# Altium schematic symbol library LATTICEPLDS_Library.SchLib: 291 symbols (part 19 of 32) (continued)
## LFE5U-45F-BG381 (continued)
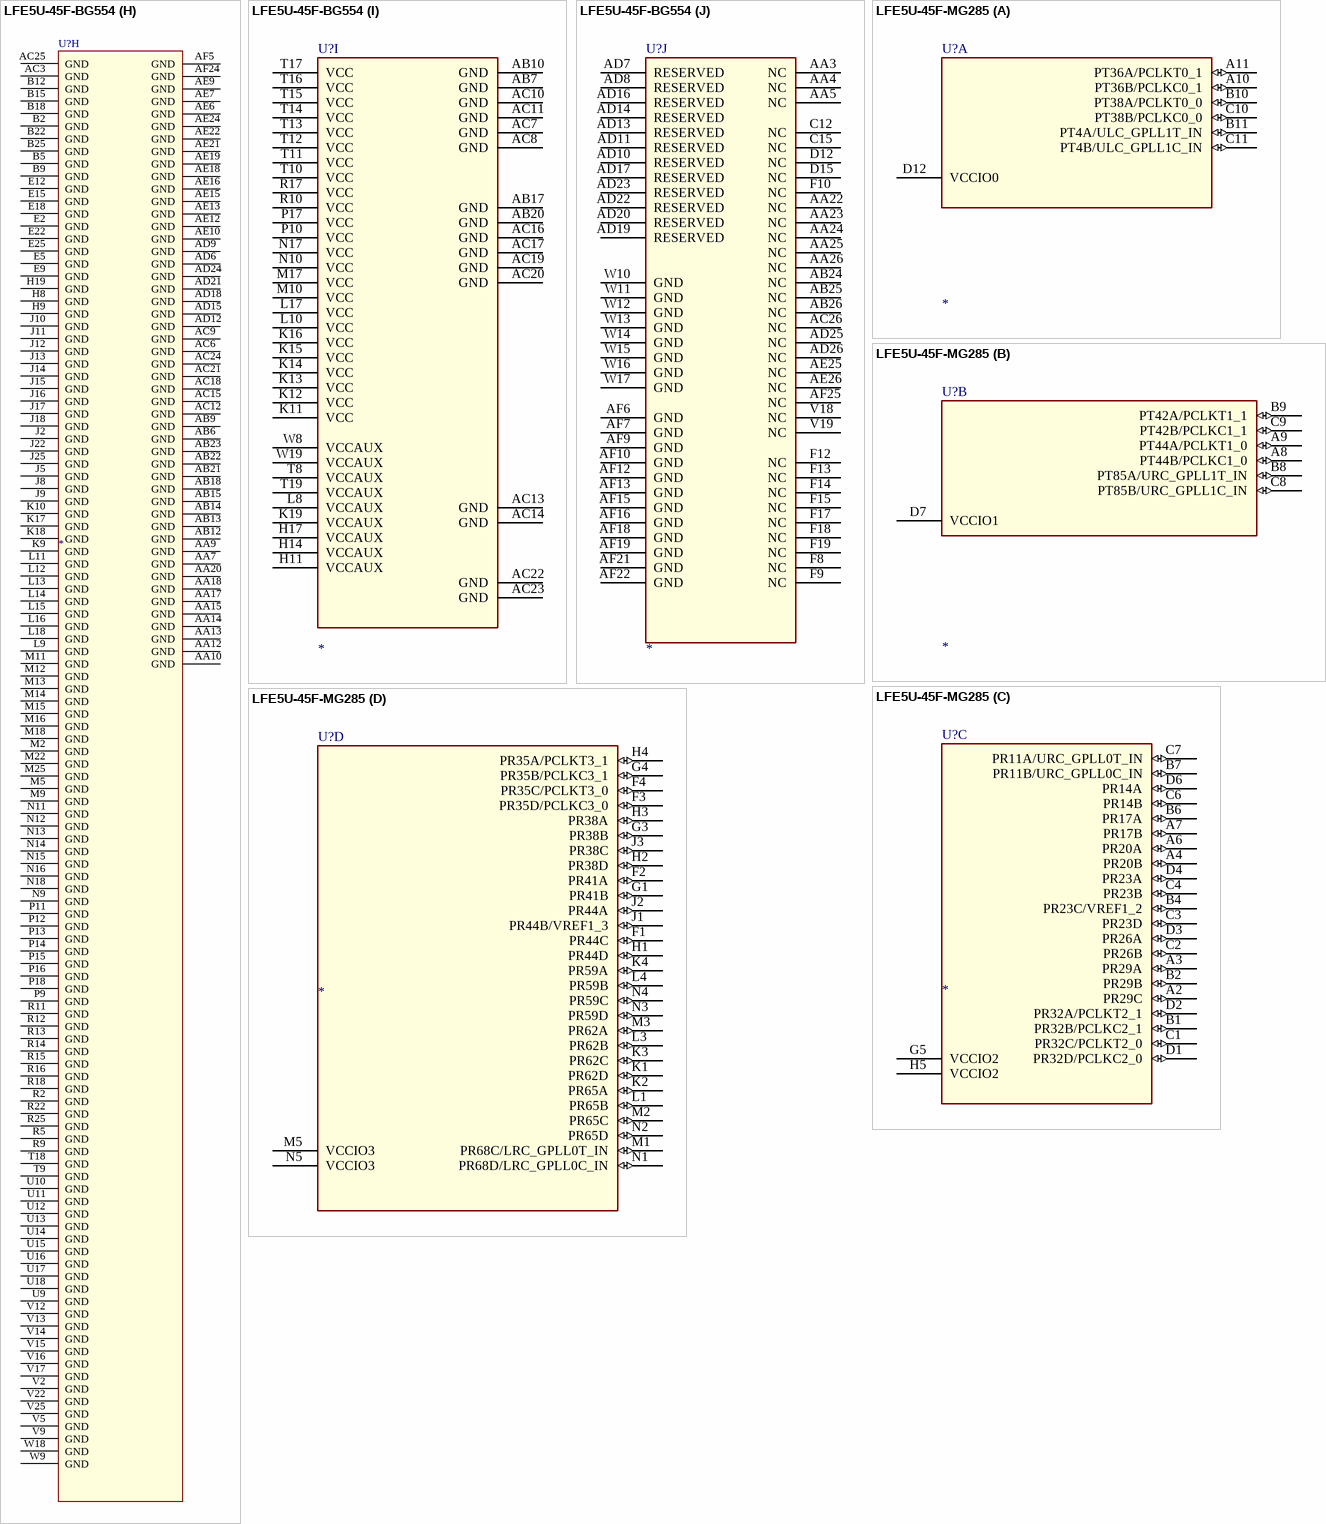
[diagram p180: symbols LFE5U-45F-BG554 to LFE5U-45F-MG285]

## LFE5U-45F-BG554
designator U?
SWAP_INFO: (S1+S2+S3+S4+S5+S6+S7+S8+S9+S10); SPLIT_INST: TRUE
part A pins: A2 PT4A/ ULC_GPLL1T_IN (io), A3 PT4B/ ULC_GPLL1C_IN (io), A4 PT6B (io), A5 PT15A (io), A6 PT15B (io), A8 PT18A (io), A9 PT18B (io), A10 PT31A (io), A11 PT31B (io), A12 PT38A/ PCLKT0_0 (io), A13 PT38B/ PCLKC0_0 (io), B4 PT6A (io), B6 PT13B (io), B8 PT20A (io), B10 PT29B (io), B11 PT33B/ GR_PCLK0_0 (io), C5 PT9B (io), C6 PT13A (io), C8 PT20B (io), C9 PT24B (io), C10 PT29A (io), C11 PT33A/ GR_PCLK0_1 (io), D5 PT9A (io), D6 PT11B (io), D8 PT22B (io), D9 PT24A (io), D10 PT27B (io), D11 PT36B/ PCLKC0_1 (io), E6 PT11A (io), E8 PT22A (io), E10 PT27A (io), E11 PT36A/ PCLKT0_1 (io), H10 VCCIO0 (power), H12 VCCIO0 (power), H13 VCCIO0 (power)
part B pins: A14 PT51A (io), A15 PT51B (io), A16 PT58A (io), A17 PT58B (io), A18 PT71A (io), A19 PT71B (io), A21 PT74A (io), A22 PT74B (io), A23 PT83A (io), A24 PT85A/ URC_GPLL1T_IN (io), A25 PT85B/ URC_GPLL1C_IN (io), B13 PT49A (io), B14 PT49B (io), B16 PT56A (io), B17 PT60A (io), B19 PT69B (io), B21 PT76A (io), B23 PT83B (io), C13 PT47A/ GR_PCLK1_0 (io), C14 PT47B/ GR_PCLK1_1 (io), C16 PT56B (io), C17 PT60B (io), C18 PT65A (io), C19 PT69A (io), C21 PT76B (io), C22 PT80A (io), D13 PT44A/ PCLKT1_0 (io), D14 PT44B/ PCLKC1_0 (io), D16 PT53A (io), D17 PT62A (io), D18 PT65B (io), D19 PT67B (io), D21 PT78A (io), D22 PT80B (io), E13 PT42A/ PCLKT1_1 (io), E14 PT42B/ PCLKC1_1 (io), E16 PT53B (io), E17 PT62B (io), E19 PT67A (io), E21 PT78B (io), H15 VCCIO1 (power), H16 VCCIO1 (power), H18 VCCIO1 (power)
part C pins: B24 PR14D (io), B26 PR14C (io), C23 PR11C (io), C24 PR11D (io), C25 PR11A/ URC_GPLL0T_IN (io), C26 PR11B/ URC_GPLL0C_IN (io), D23 PR14A (io), D24 PR14B (io), D25 PR17A (io), D26 PR17D (io), E23 PR20C (io), E24 PR17C (io), E26 PR17B (io), F22 PR23A (io), F23 PR23B (io), F24 PR20D (io), F25 PR20A (io), F26 PR20B (io), H21 PR23D (io), H22 PR23C/ VREF1_2 (io), H23 PR26C (io), J19 VCCIO2 (power), J21 PR26A (io), J23 PR29B (io), K21 PR26B (io), K22 PR29A/ GR_PCLK2_1 (io), K23 PR32A/ PCLKT2_1 (io), L19 VCCIO2 (power), L22 PR26D (io), L23 PR32B/ PCLKC2_1 (io), M19 VCCIO2 (power), M21 PR29C/ GR_PCLK2_0 (io), M23 PR29D (io), N19 VCCIO2 (power), N21 PR32C/ PCLKT2_0 (io), N22 PR32D/ PCLKC2_0 (io)
part D pins: H24 PR35A/ PCLKT3_1 (io), H25 PR35C/ PCLKT3_0 (io), H26 PR35D/ PCLKC3_0 (io), J24 PR35B/ PCLKC3_1 (io), J26 PR38B (io), K24 PR38C/ GR_PCLK3_1 (io), K25 PR38A/ GR_PCLK3_0 (io), K26 PR41C (io), L24 PR38D (io), L25 PR41A (io), L26 PR41D (io), M24 PR44D (io), M26 PR41B (io), N23 PR47D (io), N24 PR44C (io), N25 PR44B/ VREF1_3 (io), N26 PR44A (io), P19 VCCIO3 (power), P21 PR47C (io), P22 PR47B (io), P23 PR47A (io), P24 PR59D (io), P25 PR62A (io), P26 PR62B (io), R19 VCCIO3 (power), R21 PR50C (io), R23 PR50A (io), R24 PR59C (io), R26 PR62D (io), T22 PR50B (io), T23 PR50D (io), T24 PR59A (io), T25 PR62C (io), T26 PR65D (io), U19 VCCIO3 (power), U21 PR53C (io), U22 PR53B (io), U23 PR53D (io), U24 PR59B (io), U25 PR65B (io), U26 PR65C (io), V21 PR56B (io), V23 PR53A (io), V24 PR68A (io), V26 PR65A (io), W21 PR56D (io), W22 PR56C (io), W23 PR56A (io), W24 PR68D/ LRC_GPLL0C_IN (io), W25 PR68C/ LRC_GPLL0T_IN (io), W26 PR68B (io)
part E pins: H1 PL35D/ PCLKC6_0 (io), H2 PL35C/ PCLKT6_0 (io), H3 PL35A/ PCLKT6_1 (io), J1 PL38B (io), J3 PL35B/ PCLKC6_1 (io), K1 PL41C (io), K2 PL38A/ GR_PCLK6_0 (io), K3 PL38C/ GR_PCLK6_1 (io), L1 PL41D (io), L2 PL41A (io), L3 PL38D (io), M1 PL41B (io), M3 PL44D (io), N1 PL44A (io), N2 PL44B/ VREF1_6 (io), N3 PL44C (io), N4 PL47D (io), P1 PL62B (io), P2 PL62A (io), P3 PL59D (io), P4 PL47A (io), P5 PL47B (io), P6 PL47C (io), P8 VCCIO6 (power), R1 PL62D (io), R3 PL59C (io), R4 PL50A (io), R6 PL50C (io), R8 VCCIO6 (power), T1 PL65D (io), T2 PL62C (io), T3 PL59A (io), T4 PL50D (io), T5 PL50B (io), U1 PL65C (io), U2 PL65B (io), U3 PL59B (io), U4 PL53D (io), U5 PL53B (io), U6 PL53C (io), U8 VCCIO6 (power), V1 PL65A (io), V3 PL68A (io), V4 PL53A (io), V6 PL56B (io), V8 VCCIO6 (power), W1 PL68B (io), W2 PL68C/ LLC_GPLL0T_IN (io), W3 PL68D/ LLC_GPLL0C_IN (io), W4 PL56A (io), W5 PL56C (io), W6 PL56D (io)
part F pins: B1 PL14C (io), B3 PL14D (io), C1 PL11B/ ULC_GPLL0C_IN (io), C2 PL11A/ ULC_GPLL0T_IN (io), C3 PL11D (io), C4 PL11C (io), D1 PL17D (io), D2 PL17A (io), D3 PL14B (io), D4 PL14A (io), E1 PL17B (io), E3 PL17C (io), E4 PL20C (io), F1 PL20B (io), F2 PL20A (io), F3 PL20D (io), F4 PL23B (io), F5 PL23A (io), H4 PL26C (io), H5 PL23C/ VREF1_7 (io), H6 PL23D (io), J4 PL29B (io), J6 PL26A (io), K4 PL32A/ PCLKT7_1 (io), K5 PL29A/ GR_PCLK7_1 (io), K6 PL26B (io), K8 VCCIO7 (power), L4 PL32B/ PCLKC7_1 (io), L5 PL26D (io), M4 PL29D (io), M6 PL29C/ GR_PCLK7_0 (io), M8 VCCIO7 (power), N5 PL32D/ PCLKC7_0 (io), N6 PL32C/ PCLKT7_0 (io), N8 VCCIO7 (power)
part G pins: AA1 PB4A/ D7/IO7 (io), AA2 PB15A/ HOLDN/DI/BUSY/CSSPIN/CEN (io), AB1 PB4B/ D6/IO6 (io), AB2 PB13A/ SN/CSN (io), AB3 PB15B/ DOUT/CSON (io), AB4 PROGRAMN (io), AB5 TDO (io), AC1 PB6A/ D5/MISO2/IO5 (io), AC2 PB13B/ CS1N (io), AC4 DONE (io), AC5 TDI (io), AD1 PB6B/ D4/MOSI2/IO4 (io), AD2 PB11A/ D1/MISO/IO1 (io), AD3 PB18A/ WRITEN (io), AD4 CFG_2 (io), AD5 TCK (io), AE1 PB9A/ D3/IO3 (io), AE2 PB11B/ D0/MOSI/IO0 (io), AE3 CCLK/ MCLK/SCK (io), AE4 CFG_1 (io), AE5 TMS (io), AF2 PB9B/ D2/IO2 (io), AF3 INITN (io), AF4 CFG_0 (io), V10 VCCIO8 (power), V11 VCCIO8 (power)
part H pins: AA7 GND (power), AA9 GND (power), AA10 GND (power), AA12 GND (power), AA13 GND (power), AA14 GND (power), AA15 GND (power), AA17 GND (power), AA18 GND (power), AA20 GND (power), AB6 GND (power), AB9 GND (power), AB12 GND (power), AB13 GND (power), AB14 GND (power), AB15 GND (power), AB18 GND (power), AB21 GND (power), AB22 GND (power), AB23 GND (power), AC3 GND (power), AC6 GND (power), AC9 GND (power), AC12 GND (power), AC15 GND (power), AC18 GND (power), AC21 GND (power), AC24 GND (power), AC25 GND (power), AD6 GND (power), AD9 GND (power), AD12 GND (power), AD15 GND (power), AD18 GND (power), AD21 GND (power), AD24 GND (power), AE6 GND (power), AE7 GND (power), AE9 GND (power), AE10 GND (power), AE12 GND (power), AE13 GND (power), AE15 GND (power), AE16 GND (power), AE18 GND (power), AE19 GND (power), AE21 GND (power), AE22 GND (power), AE24 GND (power), AF5 GND (power), AF24 GND (power), B2 GND (power), B5 GND (power), B9 GND (power), B12 GND (power), B15 GND (power), B18 GND (power), B22 GND (power), B25 GND (power), E2 GND (power), E5 GND (power), E9 GND (power), E12 GND (power), E15 GND (power), E18 GND (power), E22 GND (power), E25 GND (power), H8 GND (power), H9 GND (power), H19 GND (power), J2 GND (power), J5 GND (power), J8 GND (power), J9 GND (power), J10 GND (power), J11 GND (power), J12 GND (power), J13 GND (power), J14 GND (power), J15 GND (power), J16 GND (power), J17 GND (power), J18 GND (power), J22 GND (power), J25 GND (power), K9 GND (power), K10 GND (power), K17 GND (power), K18 GND (power), L9 GND (power), L11 GND (power), L12 GND (power), L13 GND (power), L14 GND (power), L15 GND (power), L16 GND (power), L18 GND (power), M2 GND (power), M5 GND (power), M9 GND (power), M11 GND (power), M12 GND (power), M13 GND (power), M14 GND (power), M15 GND (power), M16 GND (power), M18 GND (power), M22 GND (power), M25 GND (power), N9 GND (power), N11 GND (power), N12 GND (power), N13 GND (power), N14 GND (power), N15 GND (power), N16 GND (power), N18 GND (power), P9 GND (power), P11 GND (power), P12 GND (power), P13 GND (power), P14 GND (power), P15 GND (power), P16 GND (power), P18 GND (power), R2 GND (power), R5 GND (power), R9 GND (power), R11 GND (power), R12 GND (power), R13 GND (power), R14 GND (power), R15 GND (power), R16 GND (power), R18 GND (power), R22 GND (power), R25 GND (power), T9 GND (power), T18 GND (power), U9 GND (power), U10 GND (power), U11 GND (power), U12 GND (power), U13 GND (power), U14 GND (power), U15 GND (power), U16 GND (power), U17 GND (power), U18 GND (power), V2 GND (power), V5 GND (power), V9 GND (power), V12 GND (power), V13 GND (power), V14 GND (power), V15 GND (power), V16 GND (power), V17 GND (power), V22 GND (power), V25 GND (power), W9 GND (power), W18 GND (power)
part I pins: AB7 GND (power), AB10 GND (power), AB17 GND (power), AB20 GND (power), AC7 GND (power), AC8 GND (power), AC10 GND (power), AC11 GND (power), AC13 GND (power), AC14 GND (power), AC16 GND (power), AC17 GND (power), AC19 GND (power), AC20 GND (power), AC22 GND (power), AC23 GND (power), H11 VCCAUX (power), H14 VCCAUX (power), H17 VCCAUX (power), K11 VCC (power), K12 VCC (power), K13 VCC (power), K14 VCC (power), K15 VCC (power), K16 VCC (power), K19 VCCAUX (power), L8 VCCAUX (power), L10 VCC (power), L17 VCC (power), M10 VCC (power), M17 VCC (power), N10 VCC (power), N17 VCC (power), P10 VCC (power), P17 VCC (power), R10 VCC (power), R17 VCC (power), T8 VCCAUX (power), T10 VCC (power), T11 VCC (power), T12 VCC (power), T13 VCC (power), T14 VCC (power), T15 VCC (power), T16 VCC (power), T17 VCC (power), T19 VCCAUX (power), W8 VCCAUX (power), W19 VCCAUX (power)
part J pins: AA3 NC (power), AA4 NC (power), AA5 NC (power), AA22 NC (power), AA23 NC (power), AA24 NC (power), AA25 NC (power), AA26 NC (power), AB24 NC (power), AB25 NC (power), AB26 NC (power), AC26 NC (power), AD7 RESERVED (power), AD8 RESERVED (power), AD10 RESERVED (power), AD11 RESERVED (power), AD13 RESERVED (power), AD14 RESERVED (power), AD16 RESERVED (power), AD17 RESERVED (power), AD19 RESERVED (power), AD20 RESERVED (power), AD22 RESERVED (power), AD23 RESERVED (power), AD25 NC (power), AD26 NC (power), AE25 NC (power), AE26 NC (power), AF6 GND (power), AF7 GND (power), AF9 GND (power), AF10 GND (power), AF12 GND (power), AF13 GND (power), AF15 GND (power), AF16 GND (power), AF18 GND (power), AF19 GND (power), AF21 GND (power), AF22 GND (power), AF25 NC (power), C12 NC (power), C15 NC (power), D12 NC (power), D15 NC (power), F8 NC (power), F9 NC (power), F10 NC (power), F12 NC (power), F13 NC (power), F14 NC (power), F15 NC (power), F17 NC (power), F18 NC (power), F19 NC (power), V18 NC (power), V19 NC (power), W10 GND (power), W11 GND (power), W12 GND (power), W13 GND (power), W14 GND (power), W15 GND (power), W16 GND (power), W17 GND (power)

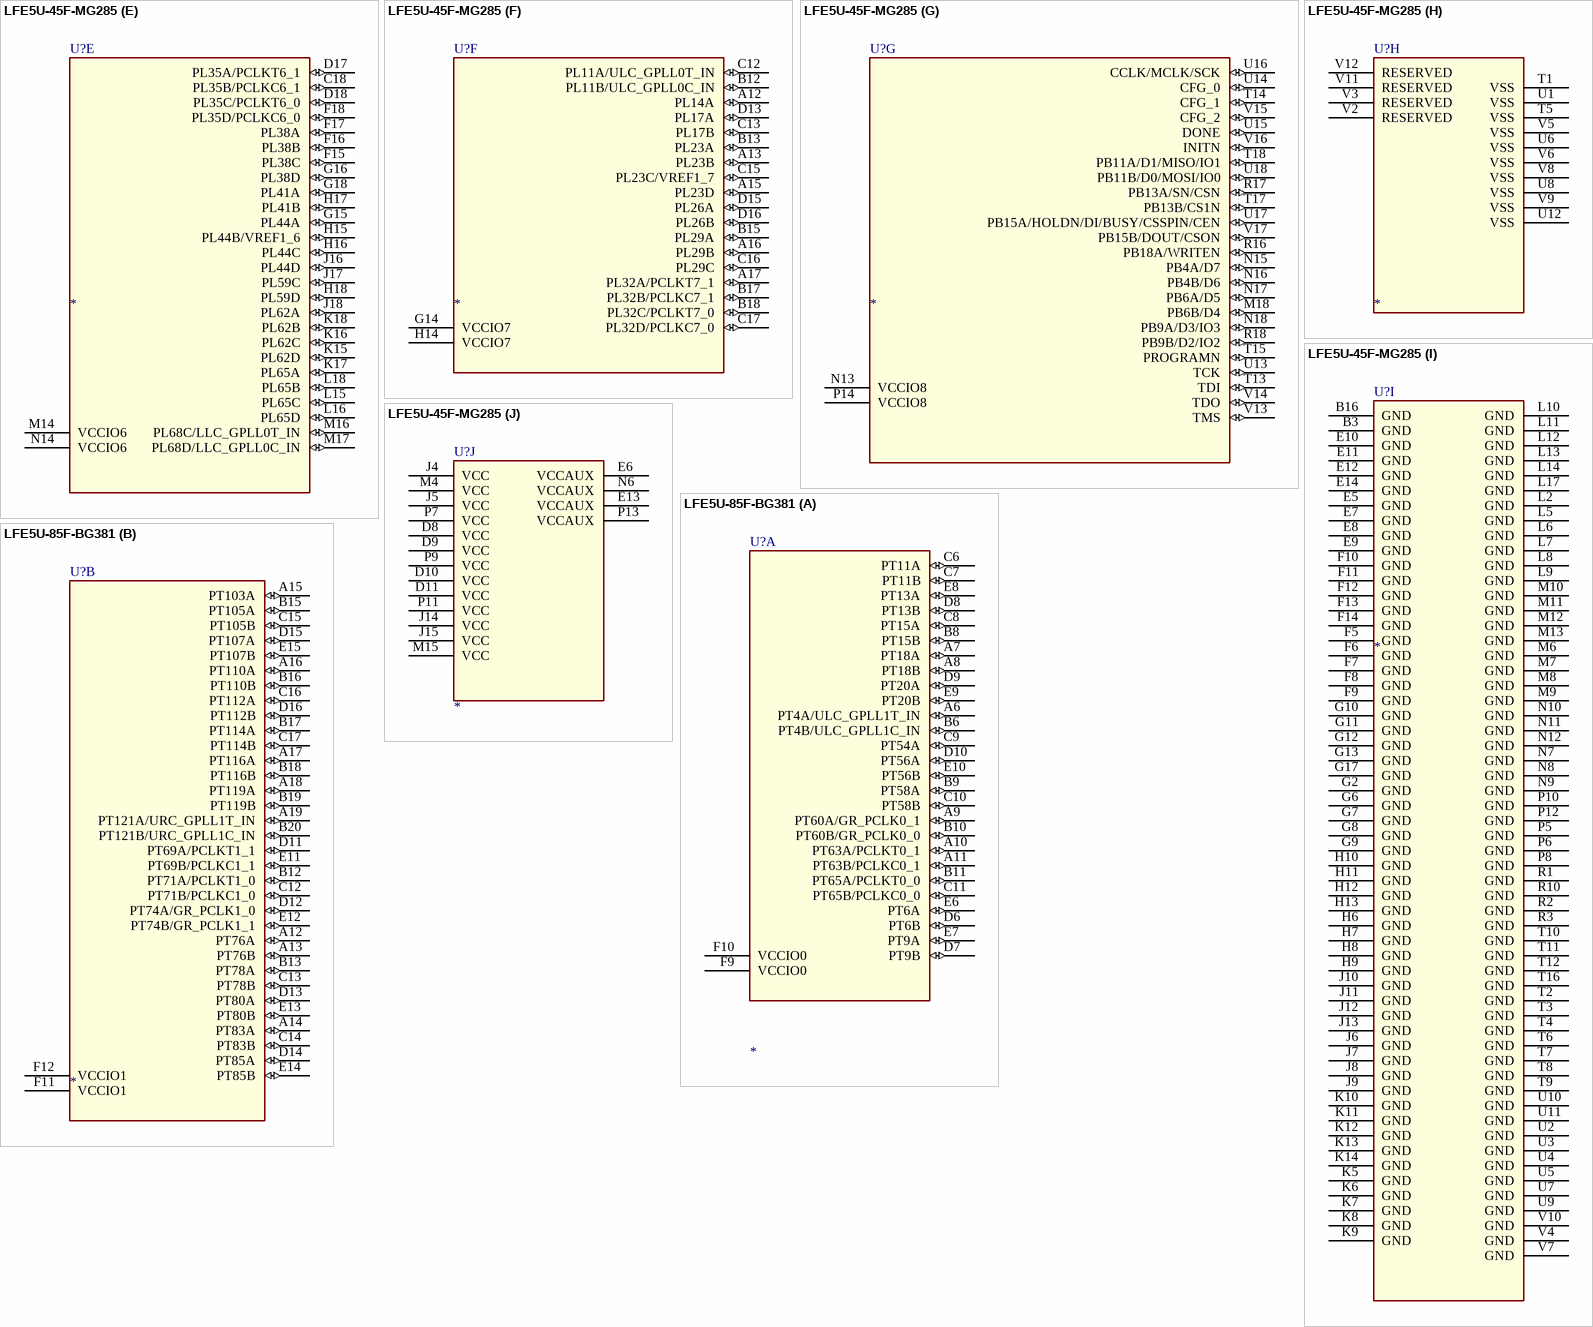
[diagram p181: symbols LFE5U-45F-MG285 to LFE5U-85F-BG381]

## LFE5U-45F-MG285
designator U?
SWAP_INFO: (S1+S2+S3+S4+S5+S6+S7+S8+S9+S10); SPLIT_INST: TRUE
part A pins: A10 PT36B/PCLKC0_1 (io), A11 PT36A/PCLKT0_1 (io), B10 PT38A/PCLKT0_0 (io), B11 PT4A/ULC_GPLL1T_IN (io), C10 PT38B/PCLKC0_0 (io), C11 PT4B/ULC_GPLL1C_IN (io), D12 VCCIO0 (power)
part B pins: A8 PT44B/PCLKC1_0 (io), A9 PT44A/PCLKT1_0 (io), B8 PT85A/URC_GPLL1T_IN (io), B9 PT42A/PCLKT1_1 (io), C8 PT85B/URC_GPLL1C_IN (io), C9 PT42B/PCLKC1_1 (io), D7 VCCIO1 (power)
part C pins: A2 PR29C (io), A3 PR29A (io), A4 PR20B (io), A6 PR20A (io), A7 PR17B (io), B1 PR32B/PCLKC2_1 (io), B2 PR29B (io), B4 PR23C/VREF1_2 (io), B6 PR17A (io), B7 PR11B/URC_GPLL0C_IN (io), C1 PR32C/PCLKT2_0 (io), C2 PR26B (io), C3 PR23D (io), C4 PR23B (io), C6 PR14B (io), C7 PR11A/URC_GPLL0T_IN (io), D1 PR32D/PCLKC2_0 (io), D2 PR32A/PCLKT2_1 (io), D3 PR26A (io), D4 PR23A (io), D6 PR14A (io), G5 VCCIO2 (power), H5 VCCIO2 (power)
part D pins: F1 PR44C (io), F2 PR41A (io), F3 PR35D/PCLKC3_0 (io), F4 PR35C/PCLKT3_0 (io), G1 PR41B (io), G3 PR38B (io), G4 PR35B/PCLKC3_1 (io), H1 PR44D (io), H2 PR38D (io), H3 PR38A (io), H4 PR35A/PCLKT3_1 (io), J1 PR44B/VREF1_3 (io), J2 PR44A (io), J3 PR38C (io), K1 PR62D (io), K2 PR65A (io), K3 PR62C (io), K4 PR59A (io), L1 PR65B (io), L3 PR62B (io), L4 PR59B (io), M1 PR68C/LRC_GPLL0T_IN (io), M2 PR65C (io), M3 PR62A (io), M5 VCCIO3 (power), N1 PR68D/LRC_GPLL0C_IN (io), N2 PR65D (io), N3 PR59D (io), N4 PR59C (io), N5 VCCIO3 (power)
part E pins: C18 PL35B/PCLKC6_1 (io), D17 PL35A/PCLKT6_1 (io), D18 PL35C/PCLKT6_0 (io), F15 PL38C (io), F16 PL38B (io), F17 PL38A (io), F18 PL35D/PCLKC6_0 (io), G15 PL44A (io), G16 PL38D (io), G18 PL41A (io), H15 PL44B/VREF1_6 (io), H16 PL44C (io), H17 PL41B (io), H18 PL59D (io), J16 PL44D (io), J17 PL59C (io), J18 PL62A (io), K15 PL62D (io), K16 PL62C (io), K17 PL65A (io), K18 PL62B (io), L15 PL65C (io), L16 PL65D (io), L18 PL65B (io), M14 VCCIO6 (power), M16 PL68C/LLC_GPLL0T_IN (io), M17 PL68D/LLC_GPLL0C_IN (io), N14 VCCIO6 (power)
part F pins: A12 PL14A (io), A13 PL23B (io), A15 PL23D (io), A16 PL29B (io), A17 PL32A/PCLKT7_1 (io), B12 PL11B/ULC_GPLL0C_IN (io), B13 PL23A (io), B15 PL29A (io), B17 PL32B/PCLKC7_1 (io), B18 PL32C/PCLKT7_0 (io), C12 PL11A/ULC_GPLL0T_IN (io), C13 PL17B (io), C15 PL23C/VREF1_7 (io), C16 PL29C (io), C17 PL32D/PCLKC7_0 (io), D13 PL17A (io), D15 PL26A (io), D16 PL26B (io), G14 VCCIO7 (power), H14 VCCIO7 (power)
part G pins: M18 PB6B/D4 (io), N13 VCCIO8 (power), N15 PB4A/D7 (io), N16 PB4B/D6 (io), N17 PB6A/D5 (io), N18 PB9A/D3/IO3 (io), P14 VCCIO8 (power), R16 PB18A/WRITEN (io), R17 PB13A/SN/CSN (io), R18 PB9B/D2/IO2 (io), T13 TDI (io), T14 CFG_1 (io), T15 PROGRAMN (io), T17 PB13B/CS1N (io), T18 PB11A/D1/MISO/IO1 (io), U13 TCK (io), U14 CFG_0 (io), U15 DONE (io), U16 CCLK/MCLK/SCK (io), U17 PB15A/HOLDN/DI/BUSY/CSSPIN/CEN (io), U18 PB11B/D0/MOSI/IO0 (io), V13 TMS (io), V14 TDO (io), V15 CFG_2 (io), V16 INITN (io), V17 PB15B/DOUT/CSON (io)
part H pins: T1 VSS (power), T5 VSS (power), U1 VSS (power), U6 VSS (power), U8 VSS (power), U12 VSS (power), V2 RESERVED (power), V3 RESERVED (power), V5 VSS (power), V6 VSS (power), V8 VSS (power), V9 VSS (power), V11 RESERVED (power), V12 RESERVED (power)
part I pins: B3 GND (power), B16 GND (power), E5 GND (power), E7 GND (power), E8 GND (power), E9 GND (power), E10 GND (power), E11 GND (power), E12 GND (power), E14 GND (power), F5 GND (power), F6 GND (power), F7 GND (power), F8 GND (power), F9 GND (power), F10 GND (power), F11 GND (power), F12 GND (power), F13 GND (power), F14 GND (power), G2 GND (power), G6 GND (power), G7 GND (power), G8 GND (power), G9 GND (power), G10 GND (power), G11 GND (power), G12 GND (power), G13 GND (power), G17 GND (power), H6 GND (power), H7 GND (power), H8 GND (power), H9 GND (power), H10 GND (power), H11 GND (power), H12 GND (power), H13 GND (power), J6 GND (power), J7 GND (power), J8 GND (power), J9 GND (power), J10 GND (power), J11 GND (power), J12 GND (power), J13 GND (power), K5 GND (power), K6 GND (power), K7 GND (power), K8 GND (power), K9 GND (power), K10 GND (power), K11 GND (power), K12 GND (power), K13 GND (power), K14 GND (power), L2 GND (power), L5 GND (power), L6 GND (power), L7 GND (power), L8 GND (power), L9 GND (power), L10 GND (power), L11 GND (power), L12 GND (power), L13 GND (power), L14 GND (power), L17 GND (power), M6 GND (power), M7 GND (power), M8 GND (power), M9 GND (power), M10 GND (power), M11 GND (power), M12 GND (power), M13 GND (power), N7 GND (power), N8 GND (power), N9 GND (power), N10 GND (power), N11 GND (power), N12 GND (power), P5 GND (power), P6 GND (power), P8 GND (power), P10 GND (power), P12 GND (power), R1 GND (power), R2 GND (power), R3 GND (power), R10 GND (power), T2 GND (power), T3 GND (power), T4 GND (power), T6 GND (power), T7 GND (power), T8 GND (power), T9 GND (power), T10 GND (power), T11 GND (power), T12 GND (power), T16 GND (power), U2 GND (power), U3 GND (power), U4 GND (power), U5 GND (power), U7 GND (power), U9 GND (power), U10 GND (power), U11 GND (power), V4 GND (power), V7 GND (power), V10 GND (power)
part J pins: D8 VCC (power), D9 VCC (power), D10 VCC (power), D11 VCC (power), E6 VCCAUX (power), E13 VCCAUX (power), J4 VCC (power), J5 VCC (power), J14 VCC (power), J15 VCC (power), M4 VCC (power), M15 VCC (power), N6 VCCAUX (power), P7 VCC (power), P9 VCC (power), P11 VCC (power), P13 VCCAUX (power)

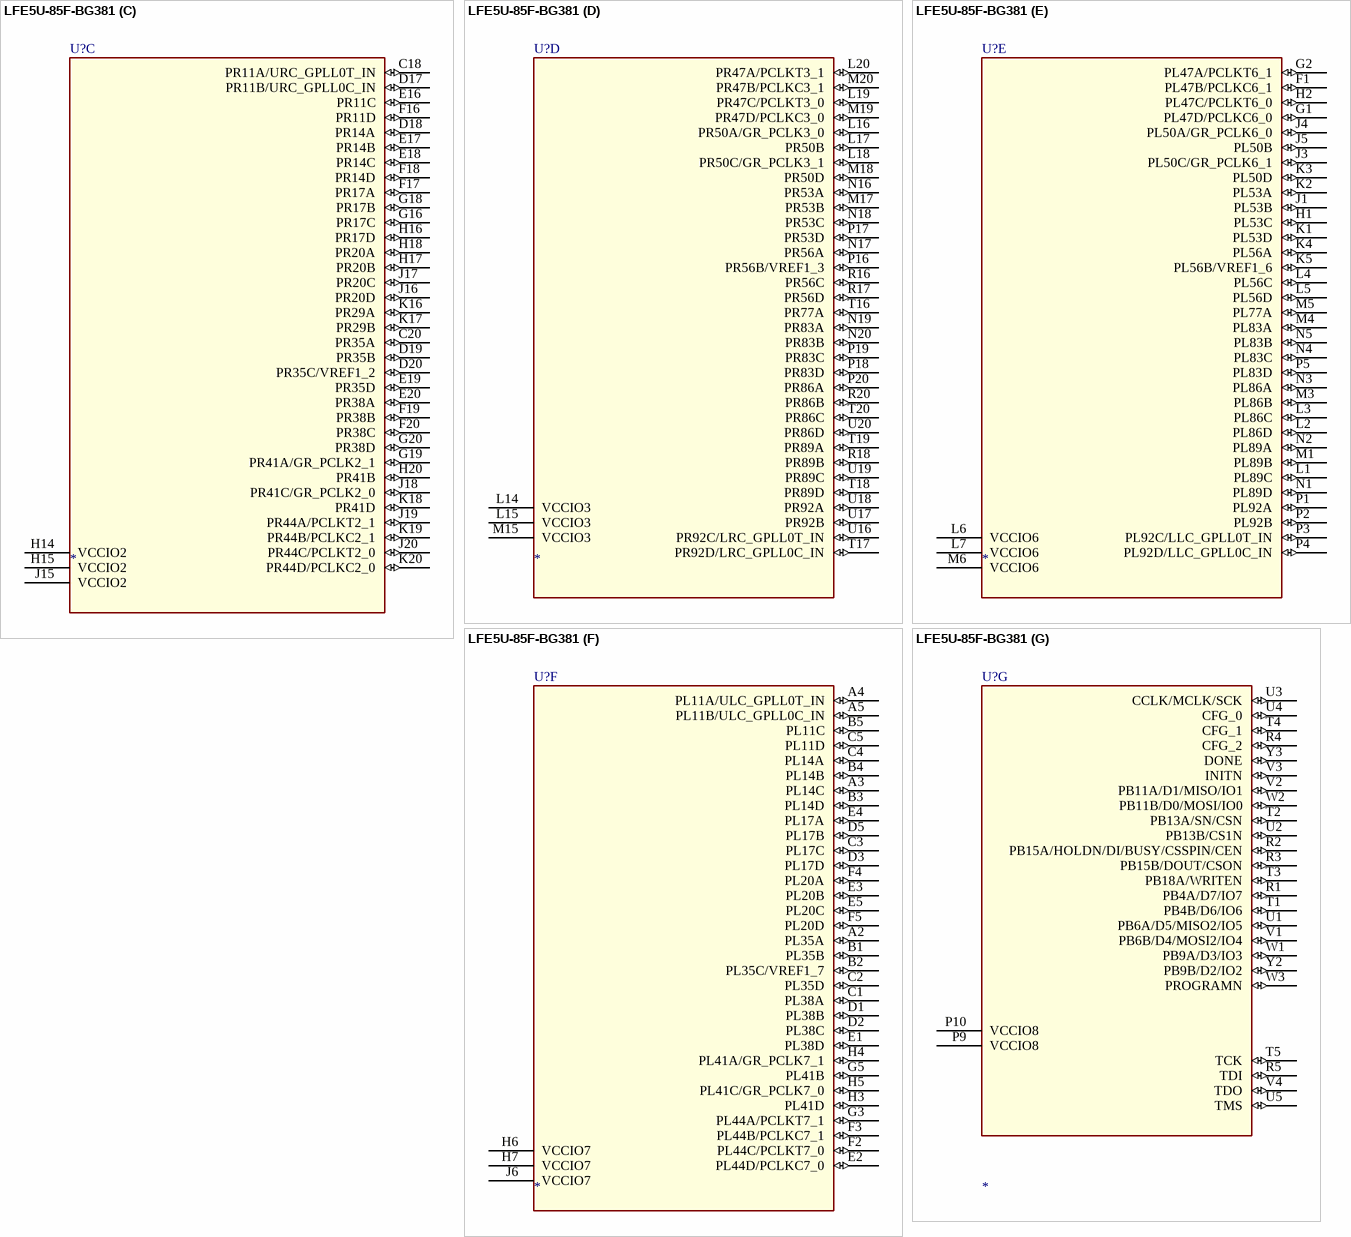
[diagram p182: symbol LFE5U-85F-BG381]

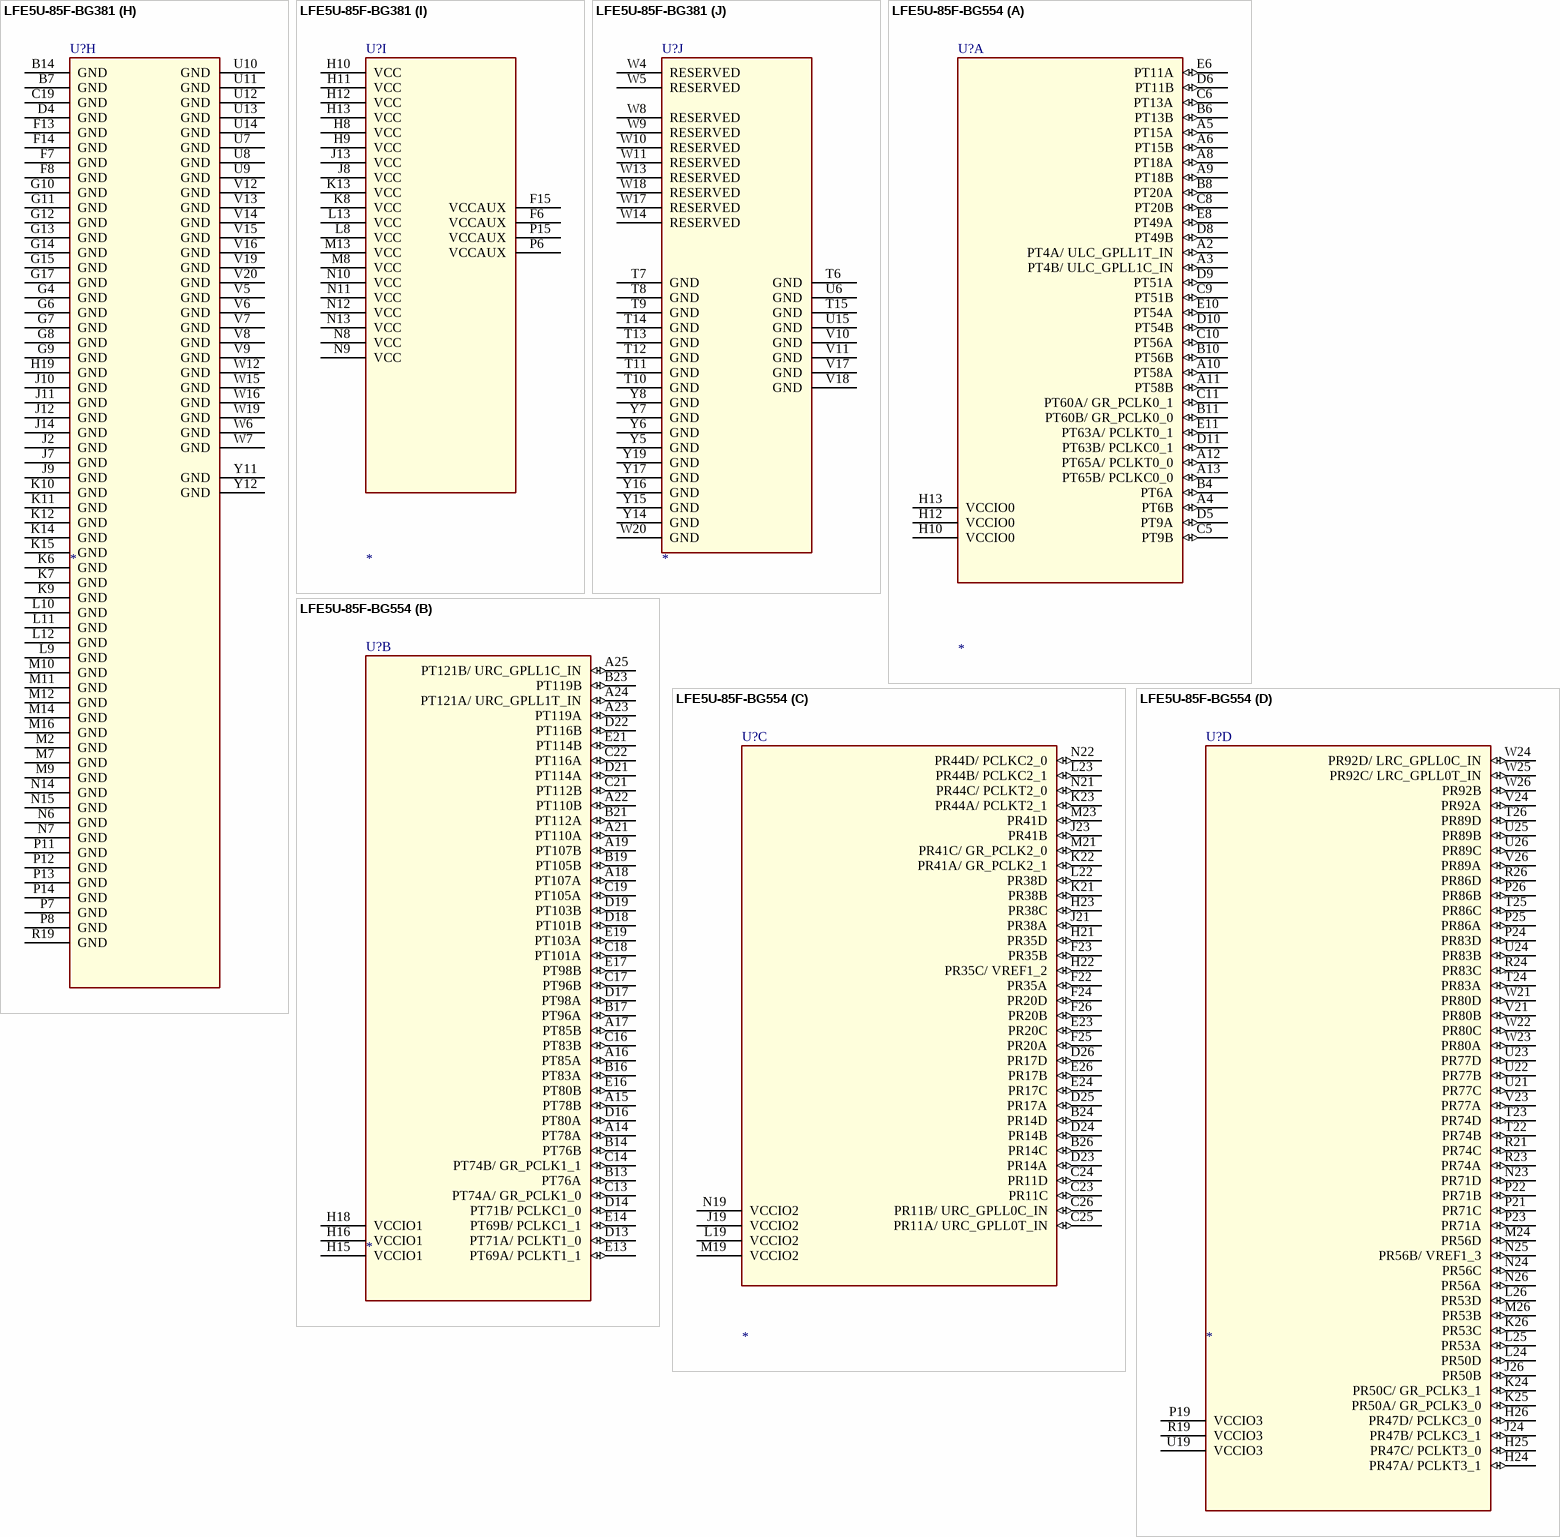
[diagram p183: symbols LFE5U-85F-BG381 to LFE5U-85F-BG554]

## LFE5U-85F-BG381
designator U?
SPLIT_INST: TRUE; SWAP_INFO: (S1+S2+S3+S4+S5+S6+S7+S8+S9+S10)
part A pins: A6 PT4A/ULC_GPLL1T_IN (io), A7 PT18A (io), A8 PT18B (io), A9 PT60A/GR_PCLK0_1 (io), A10 PT63A/PCLKT0_1 (io), A11 PT63B/PCLKC0_1 (io), B6 PT4B/ULC_GPLL1C_IN (io), B8 PT15B (io), B9 PT58A (io), B10 PT60B/GR_PCLK0_0 (io), B11 PT65A/PCLKT0_0 (io), C6 PT11A (io), C7 PT11B (io), C8 PT15A (io), C9 PT54A (io), C10 PT58B (io), C11 PT65B/PCLKC0_0 (io), D6 PT6B (io), D7 PT9B (io), D8 PT13B (io), D9 PT20A (io), D10 PT56A (io), E6 PT6A (io), E7 PT9A (io), E8 PT13A (io), E9 PT20B (io), E10 PT56B (io), F9 VCCIO0 (power), F10 VCCIO0 (power)
part B pins: A12 PT76A (io), A13 PT76B (io), A14 PT83A (io), A15 PT103A (io), A16 PT110A (io), A17 PT116A (io), A18 PT119A (io), A19 PT121A/URC_GPLL1T_IN (io), B12 PT71A/PCLKT1_0 (io), B13 PT78A (io), B15 PT105A (io), B16 PT110B (io), B17 PT114A (io), B18 PT116B (io), B19 PT119B (io), B20 PT121B/URC_GPLL1C_IN (io), C12 PT71B/PCLKC1_0 (io), C13 PT78B (io), C14 PT83B (io), C15 PT105B (io), C16 PT112A (io), C17 PT114B (io), D11 PT69A/PCLKT1_1 (io), D12 PT74A/GR_PCLK1_0 (io), D13 PT80A (io), D14 PT85A (io), D15 PT107A (io), D16 PT112B (io), E11 PT69B/PCLKC1_1 (io), E12 PT74B/GR_PCLK1_1 (io), E13 PT80B (io), E14 PT85B (io), E15 PT107B (io), F11 VCCIO1 (power), F12 VCCIO1 (power)
part C pins: C18 PR11A/URC_GPLL0T_IN (io), C20 PR35A (io), D17 PR11B/URC_GPLL0C_IN (io), D18 PR14A (io), D19 PR35B (io), D20 PR35C/VREF1_2 (io), E16 PR11C (io), E17 PR14B (io), E18 PR14C (io), E19 PR35D (io), E20 PR38A (io), F16 PR11D (io), F17 PR17A (io), F18 PR14D (io), F19 PR38B (io), F20 PR38C (io), G16 PR17C (io), G18 PR17B (io), G19 PR41A/GR_PCLK2_1 (io), G20 PR38D (io), H14 VCCIO2 (power), H15 VCCIO2 (power), H16 PR17D (io), H17 PR20B (io), H18 PR20A (io), H20 PR41B (io), J15 VCCIO2 (power), J16 PR20D (io), J17 PR20C (io), J18 PR41C/GR_PCLK2_0 (io), J19 PR44A/PCLKT2_1 (io), J20 PR44C/PCLKT2_0 (io), K16 PR29A (io), K17 PR29B (io), K18 PR41D (io), K19 PR44B/PCLKC2_1 (io), K20 PR44D/PCLKC2_0 (io)
part D pins: L14 VCCIO3 (power), L15 VCCIO3 (power), L16 PR50A/GR_PCLK3_0 (io), L17 PR50B (io), L18 PR50C/GR_PCLK3_1 (io), L19 PR47C/PCLKT3_0 (io), L20 PR47A/PCLKT3_1 (io), M15 VCCIO3 (power), M17 PR53B (io), M18 PR50D (io), M19 PR47D/PCLKC3_0 (io), M20 PR47B/PCLKC3_1 (io), N16 PR53A (io), N17 PR56A (io), N18 PR53C (io), N19 PR83A (io), N20 PR83B (io), P16 PR56B/VREF1_3 (io), P17 PR53D (io), P18 PR83D (io), P19 PR83C (io), P20 PR86A (io), R16 PR56C (io), R17 PR56D (io), R18 PR89B (io), R20 PR86B (io), T16 PR77A (io), T17 PR92D/LRC_GPLL0C_IN (io), T18 PR89D (io), T19 PR89A (io), T20 PR86C (io), U16 PR92C/LRC_GPLL0T_IN (io), U17 PR92B (io), U18 PR92A (io), U19 PR89C (io), U20 PR86D (io)
part E pins: F1 PL47B/PCLKC6_1 (io), G1 PL47D/PCLKC6_0 (io), G2 PL47A/PCLKT6_1 (io), H1 PL53C (io), H2 PL47C/PCLKT6_0 (io), J1 PL53B (io), J3 PL50C/GR_PCLK6_1 (io), J4 PL50A/GR_PCLK6_0 (io), J5 PL50B (io), K1 PL53D (io), K2 PL53A (io), K3 PL50D (io), K4 PL56A (io), K5 PL56B/VREF1_6 (io), L1 PL89C (io), L2 PL86D (io), L3 PL86C (io), L4 PL56C (io), L5 PL56D (io), L6 VCCIO6 (power), L7 VCCIO6 (power), M1 PL89B (io), M3 PL86B (io), M4 PL83A (io), M5 PL77A (io), M6 VCCIO6 (power), N1 PL89D (io), N2 PL89A (io), N3 PL86A (io), N4 PL83C (io), N5 PL83B (io), P1 PL92A (io), P2 PL92B (io), P3 PL92C/LLC_GPLL0T_IN (io), P4 PL92D/LLC_GPLL0C_IN (io), P5 PL83D (io)
part F pins: A2 PL35A (io), A3 PL14C (io), A4 PL11A/ULC_GPLL0T_IN (io), A5 PL11B/ULC_GPLL0C_IN (io), B1 PL35B (io), B2 PL35C/VREF1_7 (io), B3 PL14D (io), B4 PL14B (io), B5 PL11C (io), C1 PL38A (io), C2 PL35D (io), C3 PL17C (io), C4 PL14A (io), C5 PL11D (io), D1 PL38B (io), D2 PL38C (io), D3 PL17D (io), D5 PL17B (io), E1 PL38D (io), E2 PL44D/PCLKC7_0 (io), E3 PL20B (io), E4 PL17A (io), E5 PL20C (io), F2 PL44C/PCLKT7_0 (io), F3 PL44B/PCLKC7_1 (io), F4 PL20A (io), F5 PL20D (io), G3 PL44A/PCLKT7_1 (io), G5 PL41B (io), H3 PL41D (io), H4 PL41A/GR_PCLK7_1 (io), H5 PL41C/GR_PCLK7_0 (io), H6 VCCIO7 (power), H7 VCCIO7 (power), J6 VCCIO7 (power)
part G pins: P9 VCCIO8 (power), P10 VCCIO8 (power), R1 PB4A/D7/IO7 (io), R2 PB15A/HOLDN/DI/BUSY/CSSPIN/CEN (io), R3 PB15B/DOUT/CSON (io), R4 CFG_2 (io), R5 TDI (io), T1 PB4B/D6/IO6 (io), T2 PB13A/SN/CSN (io), T3 PB18A/WRITEN (io), T4 CFG_1 (io), T5 TCK (io), U1 PB6A/D5/MISO2/IO5 (io), U2 PB13B/CS1N (io), U3 CCLK/MCLK/SCK (io), U4 CFG_0 (io), U5 TMS (io), V1 PB6B/D4/MOSI2/IO4 (io), V2 PB11A/D1/MISO/IO1 (io), V3 INITN (io), V4 TDO (io), W1 PB9A/D3/IO3 (io), W2 PB11B/D0/MOSI/IO0 (io), W3 PROGRAMN (io), Y2 PB9B/D2/IO2 (io), Y3 DONE (io)
part H pins: B7 GND (power), B14 GND (power), C19 GND (power), D4 GND (power), F7 GND (power), F8 GND (power), F13 GND (power), F14 GND (power), G4 GND (power), G6 GND (power), G7 GND (power), G8 GND (power), G9 GND (power), G10 GND (power), G11 GND (power), G12 GND (power), G13 GND (power), G14 GND (power), G15 GND (power), G17 GND (power), H19 GND (power), J2 GND (power), J7 GND (power), J9 GND (power), J10 GND (power), J11 GND (power), J12 GND (power), J14 GND (power), K6 GND (power), K7 GND (power), K9 GND (power), K10 GND (power), K11 GND (power), K12 GND (power), K14 GND (power), K15 GND (power), L9 GND (power), L10 GND (power), L11 GND (power), L12 GND (power), M2 GND (power), M7 GND (power), M9 GND (power), M10 GND (power), M11 GND (power), M12 GND (power), M14 GND (power), M16 GND (power), N6 GND (power), N7 GND (power), N14 GND (power), N15 GND (power), P7 GND (power), P8 GND (power), P11 GND (power), P12 GND (power), P13 GND (power), P14 GND (power), R19 GND (power), U7 GND (power), U8 GND (power), U9 GND (power), U10 GND (power), U11 GND (power), U12 GND (power), U13 GND (power), U14 GND (power), V5 GND (power), V6 GND (power), V7 GND (power), V8 GND (power), V9 GND (power), V12 GND (power), V13 GND (power), V14 GND (power), V15 GND (power), V16 GND (power), V19 GND (power), V20 GND (power), W6 GND (power), W7 GND (power), W12 GND (power), W15 GND (power), W16 GND (power), W19 GND (power), Y11 GND (power), Y12 GND (power)
part I pins: F6 VCCAUX (power), F15 VCCAUX (power), H8 VCC (power), H9 VCC (power), H10 VCC (power), H11 VCC (power), H12 VCC (power), H13 VCC (power), J8 VCC (power), J13 VCC (power), K8 VCC (power), K13 VCC (power), L8 VCC (power), L13 VCC (power), M8 VCC (power), M13 VCC (power), N8 VCC (power), N9 VCC (power), N10 VCC (power), N11 VCC (power), N12 VCC (power), N13 VCC (power), P6 VCCAUX (power), P15 VCCAUX (power)
part J pins: T6 GND (power), T7 GND (power), T8 GND (power), T9 GND (power), T10 GND (power), T11 GND (power), T12 GND (power), T13 GND (power), T14 GND (power), T15 GND (power), U6 GND (power), U15 GND (power), V10 GND (power), V11 GND (power), V17 GND (power), V18 GND (power), W4 RESERVED (power), W5 RESERVED (power), W8 RESERVED (power), W9 RESERVED (power), W10 RESERVED (power), W11 RESERVED (power), W13 RESERVED (power), W14 RESERVED (power), W17 RESERVED (power), W18 RESERVED (power), W20 GND (power), Y5 GND (power), Y6 GND (power), Y7 GND (power), Y8 GND (power), Y14 GND (power), Y15 GND (power), Y16 GND (power), Y17 GND (power), Y19 GND (power)

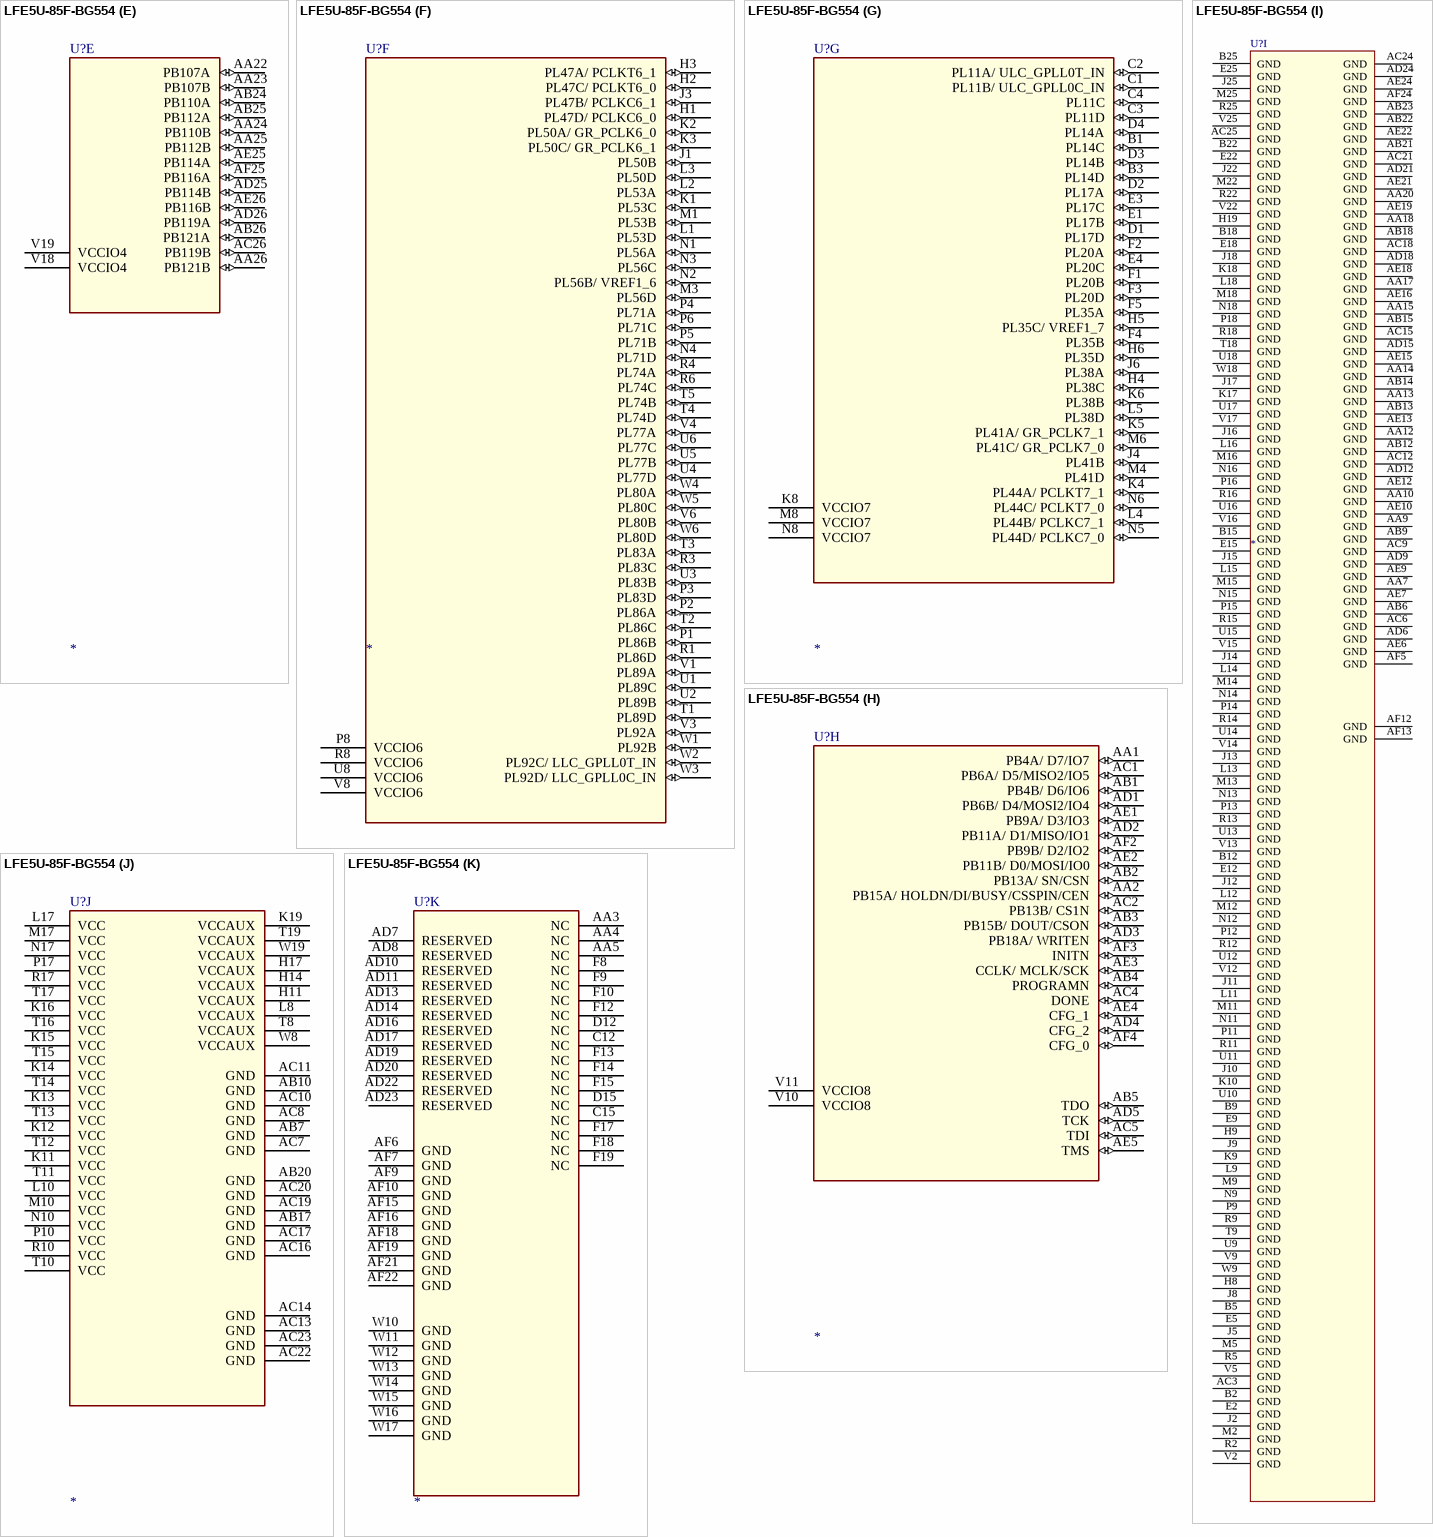
[diagram p184: symbol LFE5U-85F-BG554]